# Altium footprint library PcbLib1.PcbLib: 26 footprints (part 1 of 2)
Each footprint in its own frame and in the unit in brackets; x right, y up, seen from the top. Pads: shape width x height; smd on the part's side, far side on the other; paste and mask are expansions set on the pad; w line width, h text height; cw(c..) or ccw(c..) is an arc to the next point about the centre after c.
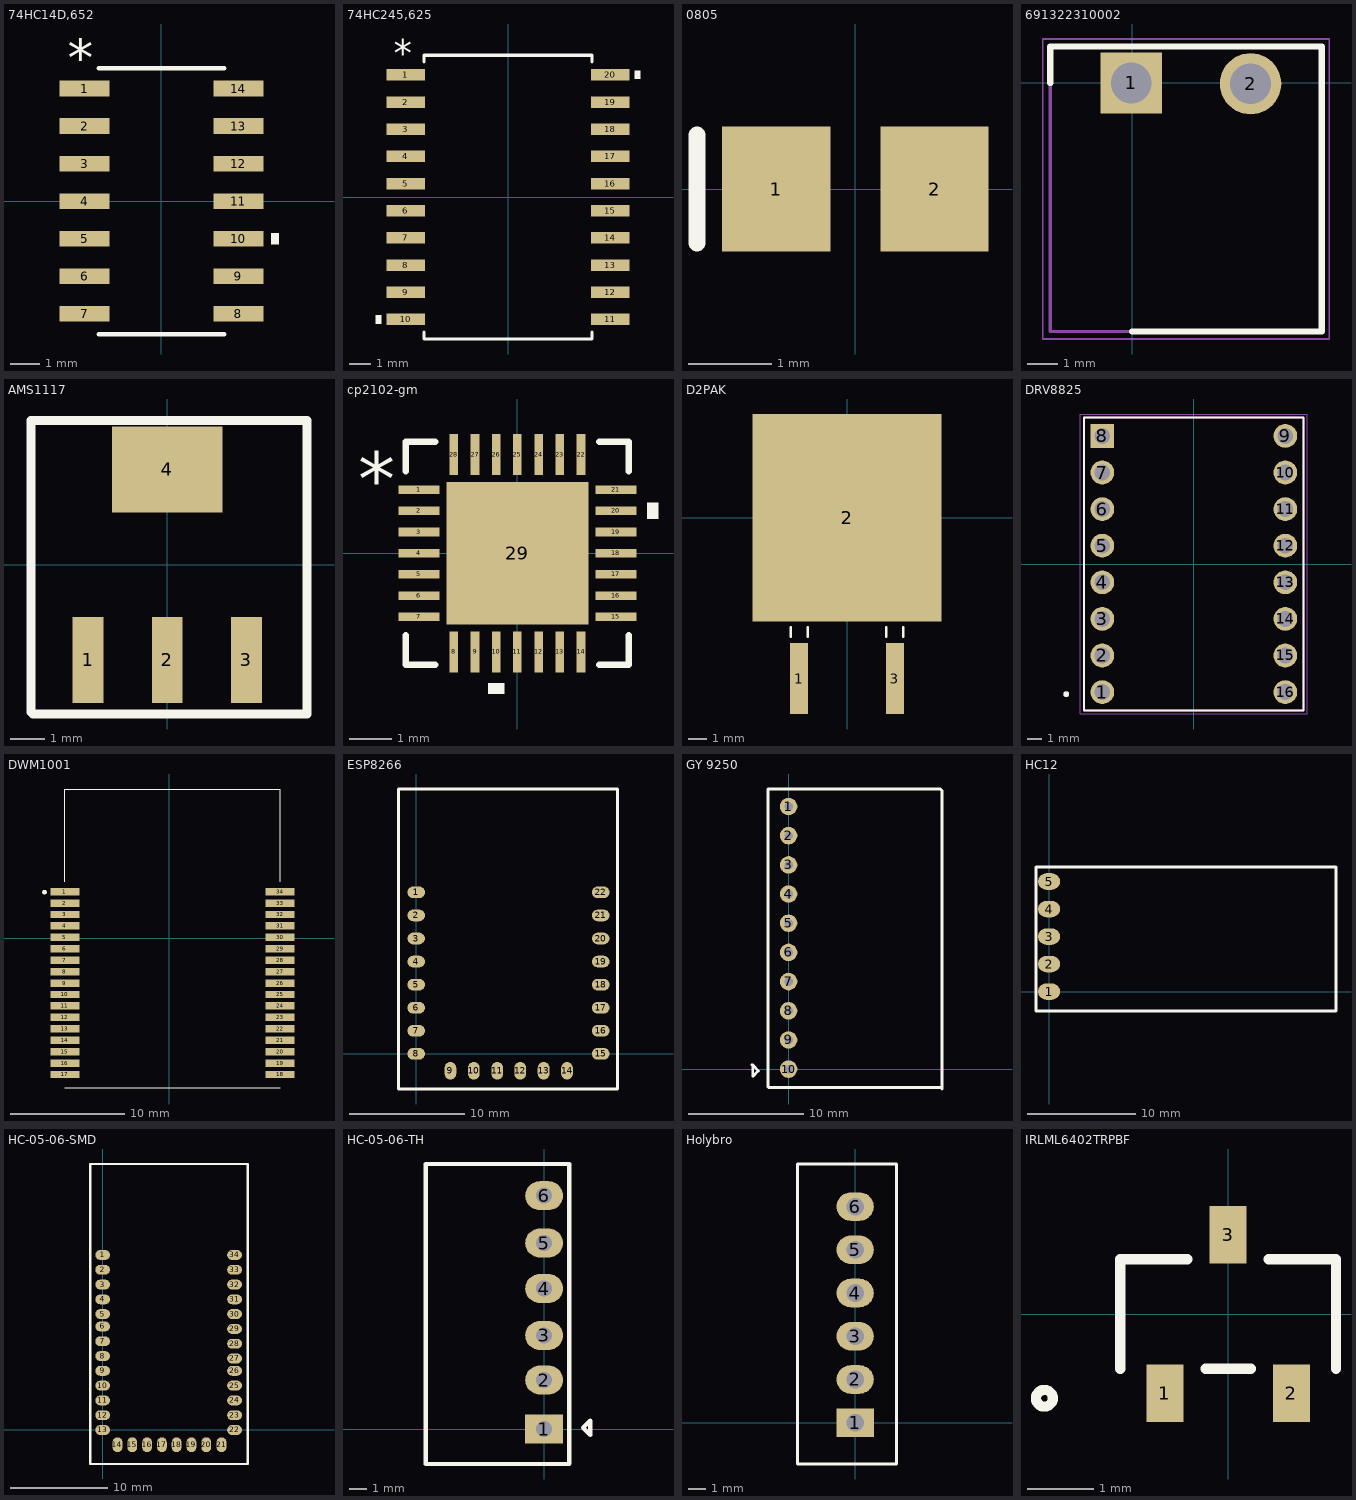
[diagram p0: the footprints below, top view; thin cyan lines are the x and y axes]

## 74HC14D,652 [mil]
pads (14):
  rect 67x21 smd paste+0 mask+0: 1(-102.5,150) 2(-102.5,100) 3(-102.5,50) 4(-102.5,0) 5(-102.5,-50) 6(-102.5,-100) 7(-102.5,-150) 8(102.5,-150) 9(102.5,-100) 10(102.5,-50) 11(102.5,0) 12(102.5,50) 13(102.5,100) 14(102.5,150)
Top Overlay:
  region: 146,-42.5 156,-42.5 156,-57.5 146,-57.5
  lines w6: -83.5,-177 83.5,-177 ; -83.5,177 83.5,177
  text "*" at -125,166 h50
3D body "SOT108-1_NEX.step": height 69.09, standoff 0, extent -122,-172 122.01,172.01
3D body: height 10, standoff 0, extent 0,0 10,10

## 74HC245,625 [mil]
pads (20):
  rect 71x21 smd paste+0 mask+0: 1(-188,225) 2(-188,175) 3(-188,125) 4(-188,75) 5(-188,25) 6(-188,-25) 7(-188,-75) 8(-188,-125) 9(-188,-175) 10(-188,-225) 11(188,-225) 12(188,-175) 13(188,-125) 14(188,-75) 15(188,-25) 16(188,25) 17(188,75) 18(188,125) 19(188,175) 20(188,225)
Top Overlay:
  region: 233.5,232.5 243.5,232.5 243.5,217.5 233.5,217.5
  region: -233.5,-217.5 -243.5,-217.5 -243.5,-232.5 -233.5,-232.5
  lines w6: -154.5,-248.6 -154.5,-261 154.5,-261 154.5,-248.6 ; -154.5,248.6 -154.5,261 154.5,261 154.5,248.6
  text "*" at -210.5,241 h50
3D body "SOT163-1_NEX.step": height 104.09, standoff 0, extent -209.49,-255.98 209.49,255.99
3D body: height 10, standoff 0, extent 0,0 10,10

## 0805 [mm] "Chip Capacitor; Body 2.0 x 1.2 mm (LxW typ)"
height 1.3
pads (2):
  rect 1.3x1.5 smd: 1(-0.95,0) 2(0.95,0)
Top Overlay:
  lines w0.2: -1.9,-0.65 -1.9,0.65
3D body "rsmd-0805_l2_w1-25_h0-6.stp": height 0.6, standoff 0, extent -1,-0.599 1,0.651

## 691322310002 [mm]
pads (2):
  rect 2.025x2.025 hole 1.35: 1(-0.025,0)
  round 2.025 hole 1.35: 2(3.912,-0.025)
Top Overlay:
  lines w0.2: -2.7,0 -2.7,1.2 6.26,1.2 6.26,-8.2 0,-8.2
Mechanical 13:
  lines w0.1: -2.7,-8.2 6.26,-8.2 6.26,1.2 -2.7,1.2 -2.7,-8.2
Mechanical 15:
  lines w0.05: -2.95,-8.45 6.51,-8.45 6.51,1.45 -2.95,1.45 -2.95,-8.45
3D body "691322310002_Download_STP_691322310002_rev1.stp": height 1.92, standoff -8.78, extent -2.5,-8.13 6.31,1.069

## AMS1117 [mil]
pads (4):
  rect 35x98 smd paste+0 mask+3: 1(-90.16,-108.5) 2(0,-108.5) 3(90.16,-108.5)
  rect 126x98 smd paste+0 mask+3: 4(0,108.5)
Top Overlay:
  lines w10: -155,-168 -155,164 159,164 159,-170 -153,-170 -155,-168
3D body "SOT_AMS_ADS.step": height 71.1, standoff 0, extent -132,-143.5 132.02,143.51

## cp2102-gm [mil]
pads (29):
  rect 38x8 smd paste+0 mask+0: 1(-91.5,59.06) 2(-91.5,39.37) 3(-91.5,19.68) 4(-91.5,0) 5(-91.5,-19.68) 6(-91.5,-39.37) 7(-91.5,-59.06) 15(91.5,-59.06) 16(91.5,-39.37) 17(91.5,-19.68) 18(91.5,0) 19(91.5,19.68) 20(91.5,39.37) 21(91.5,59.06)
  rect 8x38 smd paste+0 mask+0: 8(-59.06,-91.5) 9(-39.37,-91.5) 10(-19.68,-91.5) 11(0,-91.5) 12(19.68,-91.5) 13(39.37,-91.5) 14(59.06,-91.5) 22(59.06,91.5) 23(39.37,91.5) 24(19.68,91.5) 25(0,91.5) 26(-19.68,91.5) 27(-39.37,91.5) 28(-59.06,91.5)
  rect 132x132 smd paste-65.5 mask+0: 29(0,0)
Top Overlay:
  region: 120.5,46.87 130.5,46.87 130.5,31.87 120.5,31.87
  region: -12.19,-120.5 -27.18,-120.5 -27.18,-130.5 -12.19,-130.5
  lines w6: -103.5,-76.16 -103.5,-103.5 -76.16,-103.5 ; -103.5,76.16 -103.5,103.5 -76.16,103.5 ; 76.16,-103.5 103.5,-103.5 103.5,-76.16 ; 76.16,103.5 103.5,103.5 103.5,76.16
  text "*" at -148,43.9 h50
Top Paste:
  region: 62.06,-3.94 3.94,-3.94 3.94,-62.06 62.06,-62.06
  region: 62.06,62.06 3.94,62.06 3.94,3.94 62.06,3.94
  region: -3.94,-3.94 -62.06,-3.94 -62.06,-62.06 -3.94,-62.06
  region: -3.94,62.06 -62.06,62.06 -62.06,3.94 -3.94,3.94
3D body "QFN28_5X5_SIL.step": height 37.09, standoff 0, extent -98.49,-98.5 98.51,98.51
3D body: height 10, standoff 0, extent 0,0 10,10

## D2PAK [mil]
pads (3):
  rect 39x154 smd: 1(-103.94,-349.5) 3(103.94,-349.5)
  rect 411x451 smd: 2(0,0)
Top Overlay:
  lines w6: -122.44,-258.5 -122.44,-238.6 ; -85.44,-258.5 -85.44,-238.6 ; 85.44,-258.5 85.44,-238.6 ; 122.44,-258.5 122.44,-238.6
3D body: height 10, standoff 0, extent 0,0 10,10
3D body "D2PAK.step": height 181.1, standoff -2.01, extent -204.48,-359.01 204.49,171.62

## DRV8825 [mm]
pads (16):
  round 1.65 hole 1.1: 1(-6.35,-8.89) 2(-6.35,-6.35) 3(-6.35,-3.81) 4(-6.35,-1.27) 5(-6.35,1.27) 6(-6.35,3.81) 7(-6.35,6.35) 9(6.35,8.89) 10(6.35,6.35) 11(6.35,3.81) 12(6.35,1.27) 13(6.35,-1.27) 14(6.35,-3.81) 15(6.35,-6.35) 16(6.35,-8.89)
  rect 1.65x1.65 hole 1.1: 8(-6.35,8.89)
Top Overlay:
  circle w0.2: c-8.854,-9.034 r0.1
  lines w0.127: -7.62,-10.16 -7.62,10.16 7.62,10.16 7.62,-10.16 -7.62,-10.16
Mechanical 13:
  circle w0.2: c-8.854,-9.034 r0.1
  lines w0.127: -7.62,-10.16 7.62,-10.16 7.62,10.16 -7.62,10.16 -7.62,-10.16
Mechanical 15:
  lines w0.05: -7.87,-10.41 7.87,-10.41 7.87,10.41 -7.87,10.41 -7.87,-10.41
3D body "DRV8825 STEPPER MOTOR DRIVER CARRIER--3DModel-STEP-56544.STEP": height 11.48, standoff -0.41, extent -7.747,-10.033 7.493,10.287

## DWM1001 [mm]
pads (34):
  rect 2.54x0.65 smd: 1(-9.115,4.085) 2(-9.115,3.085) 3(-9.115,2.085) 4(-9.115,1.085) 5(-9.115,0.085) 6(-9.115,-0.915) 7(-9.115,-1.915) 8(-9.115,-2.915) 9(-9.115,-3.915) 10(-9.115,-4.915) 11(-9.115,-5.915) 12(-9.115,-6.915) 13(-9.115,-7.915) 14(-9.115,-8.915) 15(-9.115,-9.915) 16(-9.115,-10.915) 17(-9.115,-11.915) 18(9.725,-11.915) 19(9.725,-10.915) 20(9.725,-9.915) 21(9.725,-8.915) 22(9.725,-7.915) 23(9.725,-6.915) 24(9.725,-5.915) 25(9.725,-4.915) 26(9.725,-3.915) 27(9.725,-2.915) 28(9.725,-1.915) 29(9.725,-0.915) 30(9.725,0.085) 31(9.725,1.085) 32(9.725,2.085) 33(9.725,3.085) 34(9.725,4.085)
Top Overlay:
  lines w0.1: -9.115,-13.065 9.725,-13.065 ; -9.115,4.935 -9.115,13.065 9.725,13.065 9.725,4.935
  lines w0.2: -10.895,3.935 cw(c-10.895,4.035) -10.895,4.135 cw(c-10.895,4.035) -10.895,3.935
3D body "dwm1001 v2.step": height 3.2, standoff 0, extent -9.235,-13.009 9.895,13.111

## ESP8266 [mil]
pads (22):
  oval 60x40 smd: 1(0,551.18) 2(0,472.44) 3(0,393.7) 4(0,314.96) 5(0,236.22) 6(0,157.48) 7(0,78.74) 8(0,0) 15(629.92,0) 16(629.92,78.74) 17(629.92,157.48) 18(629.92,236.22) 19(629.92,314.96) 20(629.92,393.7) 21(629.92,472.44) 22(629.92,551.18)
  oval 40x60 smd: 9(117,-58) 10(197,-58) 11(277,-58) 12(355,-58) 13(435,-58) 14(515,-58)
Top Overlay:
  lines w10: -60,-120 -60,904 687,904 687,-120 -60,-120
3D body "EPS8266 ESP-12F.STEP": height 104.33, standoff -1.38, extent 0.84,-60 631.16,885.08

## GY 9250 [mil]
pads (10):
  round 60 hole 30: 1(0,900) 2(0,800) 3(0,700) 4(0,600) 5(0,500) 6(0,400) 7(0,300) 8(0,200) 9(0,100) 10(0,0)
Top Overlay:
  lines w10: -125,15 -124,15 ; 525,-68 525,955 520,960 376.25,960 78.75,960 -70,960 -70,-61 -68,-63 525,-63 ; -124,15 -123,14 -123,-24 -105,-6 -103,-6 -124,15
3D body "MPU-9250.stp": height 486.97, standoff -15.99, extent -60.28,-50 530.28,950

## HC12 [mil]
pads (5):
  oval 80x60 smd: 1(0,0) 2(0,100) 3(0,200) 4(0,300) 5(0,400)
Top Overlay:
  lines w10: -47.34,-70.8 1043.12,-70.8 1043.12,452.82 -47.34,452.82 -47.34,-70.8
3D body "HC-12 SI4463 WIRELESS SERIAL MODULE.STEP": height 1024.68, standoff 5, extent -47.34,-70.8 1043.12,452.82

## HC-05-06-SMD [mil]
pads (34):
  oval 60x40 smd: 1(0,710) 2(0,650) 3(0,590) 4(0,530) 5(0,470) 6(0,420) 7(0,360) 8(0,300) 9(0,240) 10(0,180) 11(0,120) 12(0,60) 13(0,0) 22(535,0) 23(535,60) 24(535,120) 25(535,180) 26(535,240) 27(535,290) 28(535,350) 29(535,410) 30(535,470) 31(535,530) 32(535,590) 33(535,650) 34(535,710)
  oval 40x60 smd: 14(60,-60) 15(120,-60) 16(180,-60) 17(240,-60) 18(300,-60) 19(360,-60) 20(420,-60) 21(482,-60)
Top Overlay:
  lines w10: 588,-138 -50,-138 -50,1079 588,1079 588,-138 ; 588,-138 588,-138
3D body "Bluetooth HC-06_.STEP": height 92.52, standoff 0, extent -8.98,-68 542.98,1034.76

## HC-05-06-TH [mil]
pads (6):
  rect 85x65 hole 36: 1(0,0)
  oval 85x65 hole 36: 2(0,110) 3(0,210) 4(0,315) 5(0,417) 6(0,523)
Top Overlay:
  lines w10: -265,-78 55,-78 56,-77 56,594 -265,594 -265,-76 -265,-78 ; 87,3 103,19 103,-13 87,3
3D body "HC-05.STEP": height 1628.35, standoff -48.16, extent -242,-48.96 15.87,580.96

## Holybro [mil]
pads (6):
  rect 85x65 hole 40: 1(0,0)
  oval 85x65 hole 40: 2(0,98.43) 3(0,196.85) 4(0,295.28) 5(0,393.7) 6(0,492.13)
Top Overlay:
  lines w7: -131,-94 94,-94 94,589 -131,589 -131,-94
3D body "JST - XH - Thru (V) - 6Pin - 2.54mm.stp": height 354, standoff -48, extent -131,-96 99,588

## IRLML6402TRPBF [mil]
pads (3):
  rect 22x34 smd paste+0 mask+0: 1(-37.5,-47) 2(37.5,-47) 3(0,47)
Top Overlay:
  circle w6: c-109,-50 r5
  lines w6: -64,-32.5 -64,32.5 -24.1,32.5 ; -13.4,-32.5 13.4,-32.5 ; 24.1,32.5 64,32.5 64,-32.5
3D body "SOT23_INF.step": height 43.11, standoff 0, extent -59.01,-50 59.02,50
3D body: height 10, standoff 0, extent 0,0 10,10